# Altium schematic symbol library FPGA_Xilinx_Virtex5.SchLib: 41 symbols (part 20 of 27) (continued)
## XC5VLX330-FF1760 (continued)
part P pins: AJ20 IO_L1N_8 (io), AJ21 IO_L1P_8 (io), AJ22 IO_L0N_8 (io), AJ23 IO_L0P_8 (io), AK20 IO_L3P_8 (io), AK22 IO_L2N_8 (io), AK23 IO_L2P_8 (io), AL20 IO_L3N_8 (io), AL21 IO_L5N_8 (io), AL22 IO_L17P_8 (io), AM21 IO_L5P_8 (io), AM22 IO_L17N_8 (io), AM23 IO_L15P_8 (io), AN20 IO_L7N_8 (io), AN21 IO_L9P_CC_8 (io), AN23 IO_L15N_8 (io), AN24 IO_L13N_8 (io), AP19 VCCO_8 (power), AP20 IO_L7P_8 (io), AP21 IO_L9N_CC_8 (io), AP22 IO_L19N_8 (io), AP23 IO_L13P_8 (io), AP25 IO_L4P_8 (io), AR16 VCCO_8 (power), AR18 IO_L10P_CC_8 (io), AR19 IO_L10N_CC_8 (io), AR20 IO_L14P_8 (io), AR22 IO_L19P_8 (io), AR23 IO_L11P_CC_8 (io), AR24 IO_L11N_CC_8 (io), AR25 IO_L4N_VREF_8 (io), AT16 IO_L12P_VRN_8 (io), AT17 IO_L12N_VRP_8 (io), AT19 IO_L14N_VREF_8 (io), AT20 IO_L16P_8 (io), AT21 IO_L16N_8 (io), AT22 IO_L18N_8 (io), AT24 IO_L8N_CC_8 (io), AT25 IO_L8P_CC_8 (io), AT26 IO_L6N_8 (io), AT27 IO_L6P_8 (io), AU20 VCCO_8 (power), AU21 IO_L18P_8 (io), D19 VCCO_7 (power), F22 IO_L11N_CC_7 (io), G17 IO_L12P_VRN_7 (io), G18 IO_L12N_VRP_7 (io), G19 IO_L10N_CC_7 (io), G20 VCCO_7 (power), G21 IO_L9P_CC_7 (io), G22 IO_L11P_CC_7 (io), G23 IO_L13N_7 (io), G24 IO_L15N_7 (io), G26 IO_L19P_7 (io), H17 VCCO_7 (power), H18 IO_L14N_VREF_7 (io), H19 IO_L10P_CC_7 (io), H20 IO_L9N_CC_7 (io), H21 IO_L7N_7 (io), H23 IO_L13P_7 (io), H24 IO_L15P_7 (io), H25 IO_L17P_7 (io), H26 IO_L19N_7 (io), J18 IO_L14P_7 (io), J20 IO_L16N_7 (io), J21 IO_L7P_7 (io), J22 IO_L8P_CC_7 (io), J23 IO_L8N_CC_7 (io), J25 IO_L17N_7 (io), K20 IO_L16P_7 (io), K22 IO_L6P_7 (io), K23 IO_L6N_7 (io), L20 IO_L18P_7 (io), L21 IO_L18N_7 (io), L22 IO_L4P_7 (io), M21 IO_L5N_7 (io), M22 IO_L4N_VREF_7 (io), M23 IO_L0P_7 (io), N20 IO_L1N_7 (io), N21 IO_L3N_7 (io), N22 IO_L5P_7 (io), N23 IO_L0N_7 (io), P20 IO_L1P_7 (io), P21 IO_L3P_7 (io), P22 IO_L2N_7 (io), P23 IO_L2P_7 (io)
part Q pins: AA21 VREFN_0 (io), AA22 VP_0 (io), AB21 VN_0 (io), AB22 VREFP_0 (io), AC21 DXN_0 (io), AC22 DXP_0 (io), AE30 TCK_0 (io), AF14 TMS_0 (io), AF15 CCLK_0 (io), AF30 M1_0 (io), AG14 TDI_0 (io), AG29 M0_0 (io), AG30 VCCO_0 (power), AH14 TDO_0 (io), AH15 D_OUT_BUSY_0 (io), AH28 M2_0 (io), AL28 VCCO_0 (power), R14 D_IN_0 (io), R30 RDWR_B_0 (io), T14 HSWAPEN_0 (io), T15 DONE_0 (io), T29 PROGRAM_B_0 (io), T30 CS_B_0 (io), U14 INIT_B_0 (io)
part R pins: A3 GND (power), A8 GND (power), A13 GND (power), A18 GND (power), A23 GND (power), A28 GND (power), A33 GND (power), A38 GND (power), AA12 VCCAUX (power), AA14 VCCINT (power), AA16 VCCINT (power), AA18 VCCINT (power), AA20 VCCINT (power), AA24 VCCINT (power), AA26 VCCINT (power), AA28 VCCINT (power), AA30 VCCAUX (power), AB13 VCCINT (power), AB15 VCCINT (power), AB17 VCCINT (power), AB19 VCCINT (power), AB23 VCCINT (power), AB25 VCCINT (power), AB27 VCCINT (power), AB29 VCCAUX (power), AB31 VCCAUX (power), AC12 VCCAUX (power), AC14 VCCINT (power), AC16 VCCINT (power), AC18 VCCINT (power), AC20 VCCINT (power), AC24 VCCINT (power), AC26 VCCINT (power), AC28 VCCINT (power), AC30 VCCAUX (power), AD13 VCCAUX (power), AD15 VCCINT (power), AD17 VCCINT (power), AD19 VCCINT (power), AD21 VCCINT (power), AD23 VCCINT (power), AD25 VCCINT (power), AD27 VCCINT (power), AD29 VCCAUX (power), AE12 VCCAUX (power), AE14 VCCINT (power), AE16 VCCINT (power), AE18 VCCINT (power), AE20 VCCINT (power), AE22 VCCINT (power), AE24 VCCINT (power), AE26 VCCINT (power), AE28 VCCINT (power), AF13 VCCAUX (power), AF17 VCCINT (power), AF19 VCCINT (power), AF21 VCCINT (power), AF23 VCCINT (power), AF25 VCCINT (power), AF27 VCCINT (power), AF29 VCCAUX (power), AG16 VCCINT (power), AG18 VCCINT (power), AG20 VCCINT (power), AG22 VCCINT (power), AG24 VCCINT (power), AG26 VCCINT (power), AG28 VCCINT (power), AH13 VCCAUX (power), AH17 VCCINT (power), AH19 VCCINT (power), AH21 VCCINT (power), AH23 VCCINT (power), AH25 VCCINT (power), AH27 VCCINT (power), AJ24 VCCINT (power), B5 GND (power), B10 GND (power), B20 GND (power), B30 GND (power), B40 GND (power), C2 GND (power), C7 GND (power), C17 GND (power), C27 GND (power), C37 GND (power), C42 GND (power), D4 GND (power), D14 GND (power), D24 GND (power), D34 GND (power), E1 GND (power), E11 GND (power), E21 GND (power), E31 GND (power), E41 GND (power), F8 GND (power), F18 GND (power), F28 GND (power), F38 GND (power), G5 GND (power), G15 GND (power), G25 GND (power), G35 GND (power), H2 GND (power), H12 GND (power), H22 GND (power), H32 GND (power), H42 GND (power), J9 GND (power), J19 GND (power), J29 GND (power), J34 GND (power), J39 GND (power), K1 GND (power), K6 GND (power), K11 GND (power), K16 GND (power), K21 GND (power), K26 GND (power), K31 GND (power), K36 GND (power), L3 GND (power), L13 GND (power), L18 GND (power), L23 GND (power), L28 GND (power), L33 GND (power), M10 GND (power), M15 GND (power), M20 GND (power), M25 GND (power), M30 GND (power), M40 GND (power), N2 GND (power), N7 GND (power), N12 GND (power), N17 GND (power), N27 GND (power), N32 GND (power), N37 GND (power), N42 GND (power), P4 GND (power), P14 GND (power), P19 GND (power), P24 GND (power), P29 GND (power), P34 GND (power), R1 GND (power), R11 GND (power), R12 VCCAUX (power), R13 GND (power), R16 GND (power), R19 GND (power), R20 VCCINT (power), R21 GND (power), R22 VCCINT (power), R23 GND (power), R24 VCCINT (power), R25 GND (power), R26 VCCINT (power), R29 VBATT_0 (power), R31 GND (power), R41 GND (power), T8 GND (power), T12 GND (power), T13 VCCAUX (power), T16 GND (power), T17 VCCINT (power), T18 GND (power), T19 VCCINT (power), T20 GND (power), T21 VCCINT (power), T22 GND (power), T23 VCCINT (power), T24 GND (power), T25 VCCINT (power), T26 GND (power), T27 VCCINT (power), T28 GND (power), T33 GND (power), U12 VCCAUX (power), U16 VCCINT (power), U18 VCCINT (power), U20 VCCINT (power), U22 VCCINT (power), U24 VCCINT (power), U26 VCCINT (power), U28 VCCINT (power), U30 VCCAUX (power), V13 VCCINT (power), V15 VCCINT (power), V17 VCCINT (power), V19 VCCINT (power), V21 VCCINT (power), V23 VCCINT (power), V25 VCCINT (power), V27 VCCINT (power), V29 VCCAUX (power), W12 VCCAUX (power), W14 VCCINT (power), W16 VCCINT (power), W18 VCCINT (power), W20 VCCINT (power), W22 VCCINT (power), W24 VCCINT (power), W26 VCCINT (power), W28 VCCINT (power), W30 VCCAUX (power), Y13 VCCINT (power), Y15 VCCINT (power), Y17 VCCINT (power), Y19 VCCINT (power), Y21 AVSS_0 (power), Y22 AVDD_0 (power), Y23 VCCINT (power), Y25 VCCINT (power), Y27 VCCINT (power), Y29 VCCINT (power), Y31 VCCAUX (power)
part S pins: AA3 GND (power), AA13 GND (power), AA15 GND (power), AA17 GND (power), AA19 GND (power), AA23 GND (power), AA25 GND (power), AA27 GND (power), AA29 GND (power), AA31 GND (power), AA33 GND (power), AB10 GND (power), AB12 GND (power), AB14 GND (power), AB16 GND (power), AB18 GND (power), AB20 GND (power), AB24 GND (power), AB26 GND (power), AB28 GND (power), AB30 GND (power), AB40 GND (power), AC2 GND (power), AC7 GND (power), AC13 GND (power), AC15 GND (power), AC17 GND (power), AC19 GND (power), AC23 GND (power), AC25 GND (power), AC27 GND (power), AC29 GND (power), AC31 GND (power), AC32 GND (power), AC37 GND (power), AC42 GND (power), AD4 GND (power), AD12 GND (power), AD14 GND (power), AD16 GND (power), AD18 GND (power), AD20 GND (power), AD22 GND (power), AD24 GND (power), AD26 GND (power), AD28 GND (power), AD30 GND (power), AD34 GND (power), AE1 GND (power), AE11 GND (power), AE13 GND (power), AE15 GND (power), AE17 GND (power), AE19 GND (power), AE21 GND (power), AE23 GND (power), AE25 GND (power), AE27 GND (power), AE29 GND (power), AE31 GND (power), AE41 GND (power), AF8 GND (power), AF16 GND (power), AF18 GND (power), AF20 GND (power), AF22 GND (power), AF24 GND (power), AF26 GND (power), AF28 GND (power), AF33 GND (power), AF38 GND (power), AG5 GND (power), AG13 GND (power), AG15 GND (power), AG17 GND (power), AG19 GND (power), AG21 GND (power), AG23 GND (power), AG25 GND (power), AG27 GND (power), AG35 GND (power), AH2 GND (power), AH12 GND (power), AH18 GND (power), AH20 GND (power), AH22 GND (power), AH24 GND (power), AH26 GND (power), AH32 GND (power), AH42 GND (power), AJ9 GND (power), AJ14 GND (power), AJ19 GND (power), AJ29 GND (power), AJ39 GND (power), AK1 GND (power), AK6 GND (power), AK11 GND (power), AK16 GND (power), AK21 GND (power), AK26 GND (power), AK31 GND (power), AK36 GND (power), AK41 GND (power), AL3 GND (power), AL13 GND (power), AL18 GND (power), AL23 GND (power), AL33 GND (power), AM10 GND (power), AM15 GND (power), AM20 GND (power), AM25 GND (power), AM30 GND (power), AM40 GND (power), AN2 GND (power), AN7 GND (power), AN12 GND (power), AN17 GND (power), AN22 GND (power), AN27 GND (power), AN32 GND (power), AN37 GND (power), AN42 GND (power), AP4 GND (power), AP14 GND (power), AP24 GND (power), AP29 GND (power), AP34 GND (power), AR1 GND (power), AR11 GND (power), AR21 GND (power), AR31 GND (power), AR41 GND (power), AT8 GND (power), AT18 GND (power), AT28 GND (power), AT38 GND (power), AU5 GND (power), AU15 GND (power), AU25 GND (power), AU35 GND (power), AV2 GND (power), AV12 GND (power), AV22 GND (power), AV32 GND (power), AV42 GND (power), AW9 GND (power), AW19 GND (power), AW29 GND (power), AW39 GND (power), AY1 GND (power), AY6 GND (power), AY16 GND (power), AY26 GND (power), AY36 GND (power), AY41 GND (power), BA3 GND (power), BA13 GND (power), BA23 GND (power), BA33 GND (power), BA38 GND (power), BB5 GND (power), BB10 GND (power), BB15 GND (power), BB20 GND (power), BB25 GND (power), BB30 GND (power), BB35 GND (power), BB40 GND (power), T38 GND (power), U5 GND (power), U10 GND (power), U13 GND (power), U15 GND (power), U17 GND (power), U19 GND (power), U21 GND (power), U23 GND (power), U25 GND (power), U27 GND (power), U29 GND (power), U35 GND (power), V2 GND (power), V12 GND (power), V14 GND (power), V16 GND (power), V18 GND (power), V20 GND (power), V22 GND (power), V24 GND (power), V26 GND (power), V28 GND (power), V30 GND (power), V32 GND (power), V42 GND (power), W9 GND (power), W13 GND (power), W15 GND (power), W17 GND (power), W19 GND (power), W21 GND (power), W23 GND (power), W25 GND (power), W27 GND (power), W29 GND (power), W31 GND (power), W34 GND (power), W39 GND (power), Y1 GND (power), Y6 GND (power), Y11 GND (power), Y12 GND (power), Y14 GND (power), Y16 GND (power), Y18 GND (power), Y20 GND (power), Y24 GND (power), Y26 GND (power), Y28 GND (power), Y30 GND (power), Y36 GND (power)

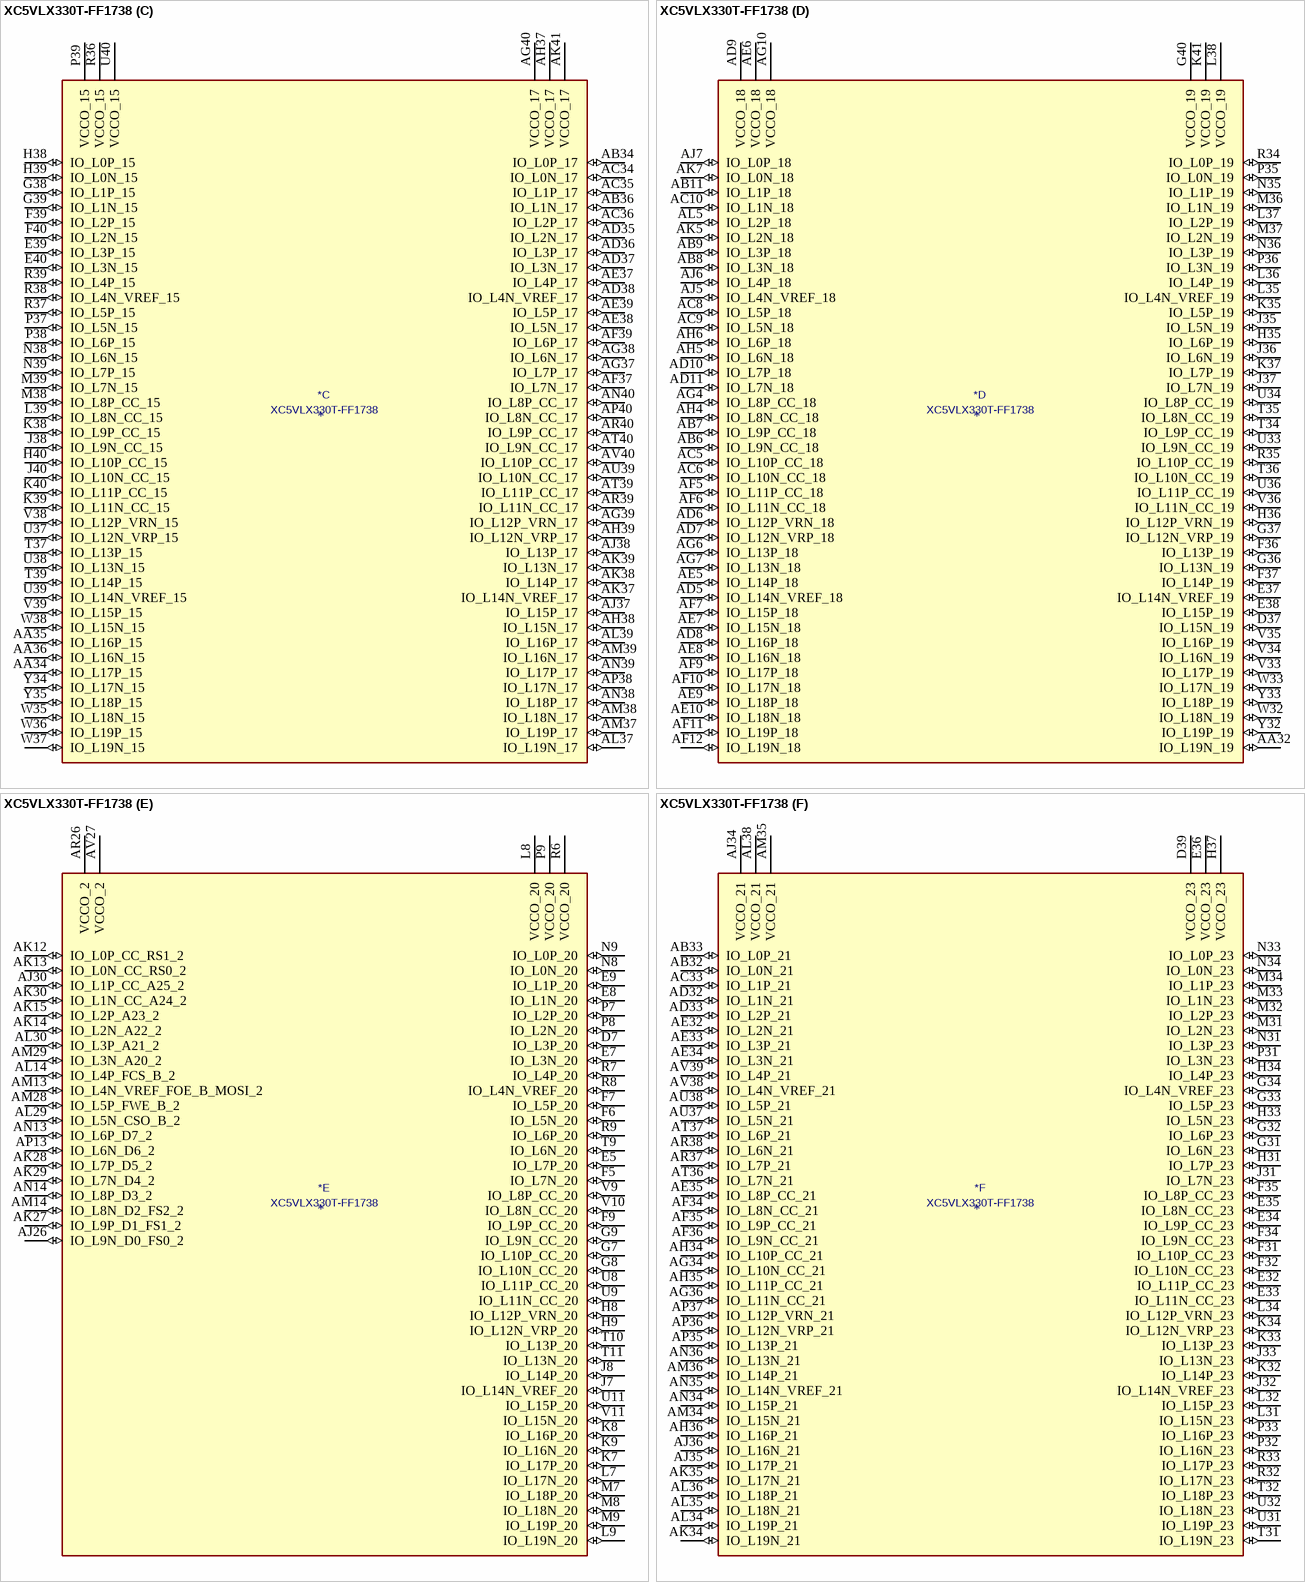
[diagram p104: symbol XC5VLX330T-FF1738]

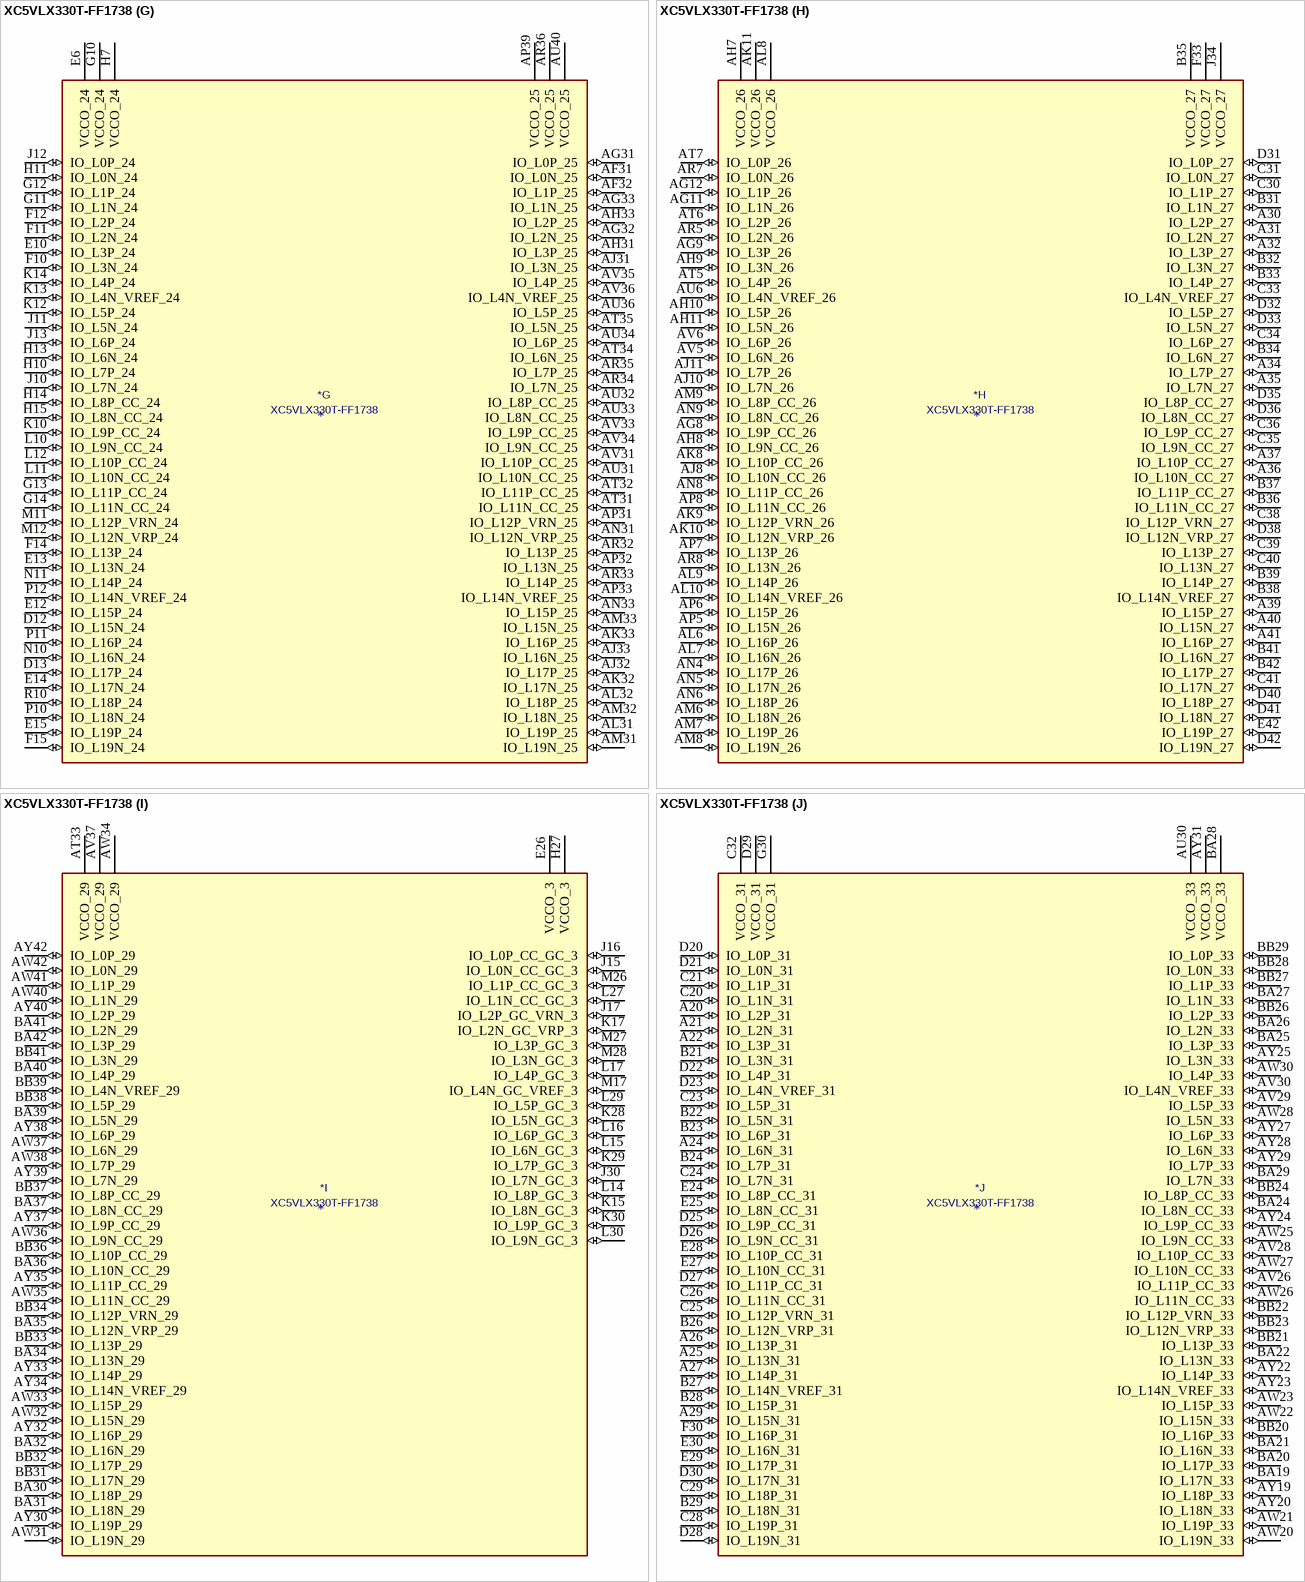
[diagram p105: symbol XC5VLX330T-FF1738]

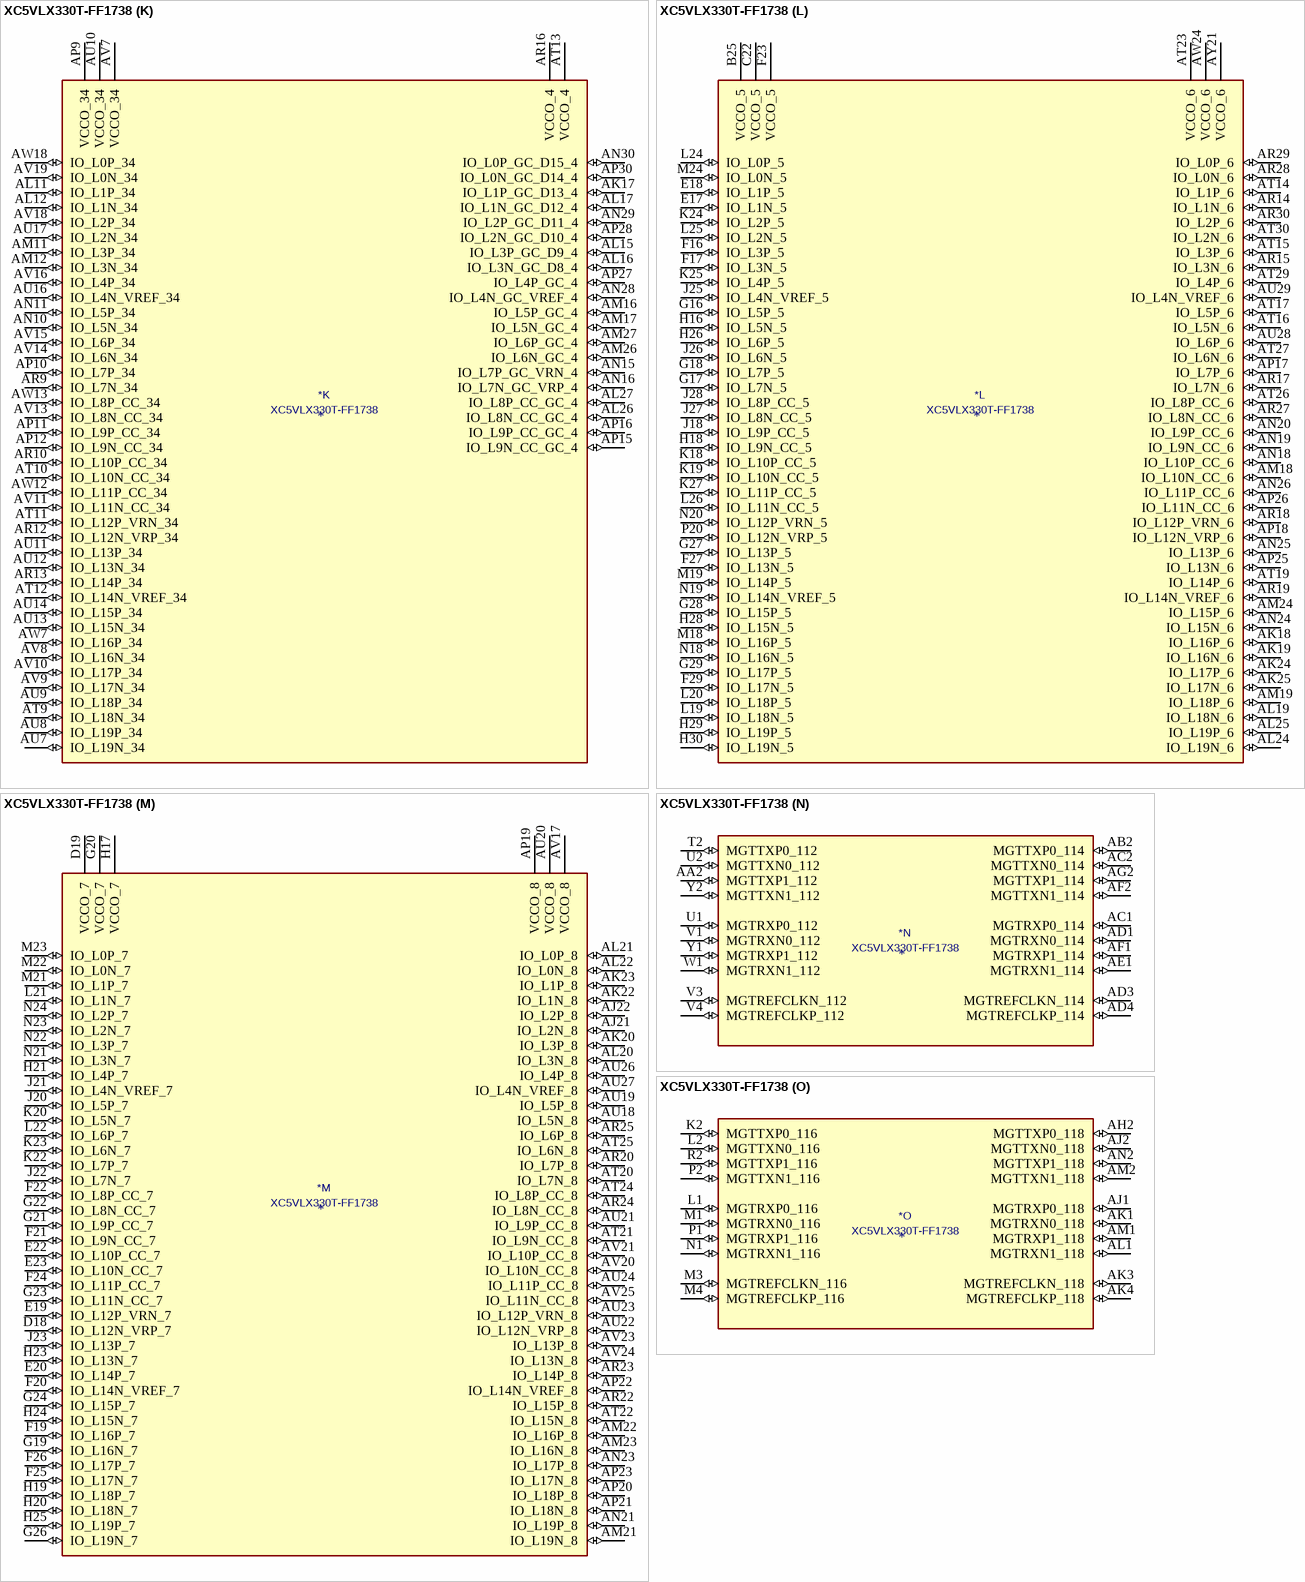
[diagram p106: symbol XC5VLX330T-FF1738]

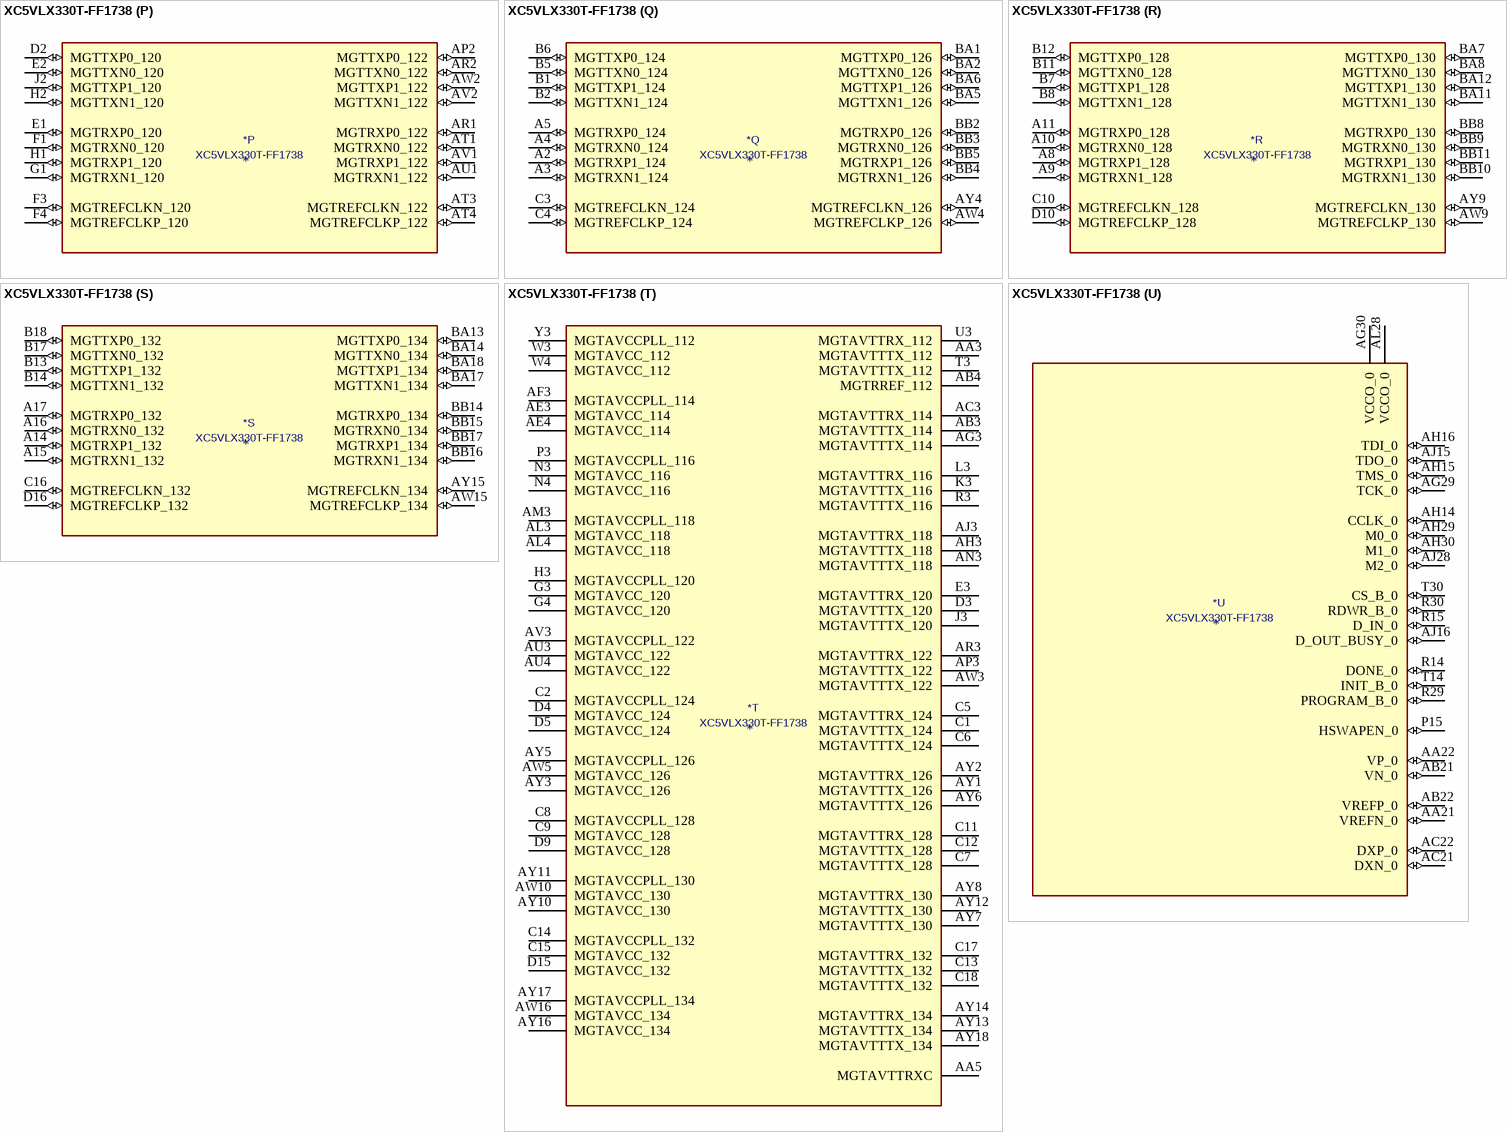
[diagram p107: symbol XC5VLX330T-FF1738]

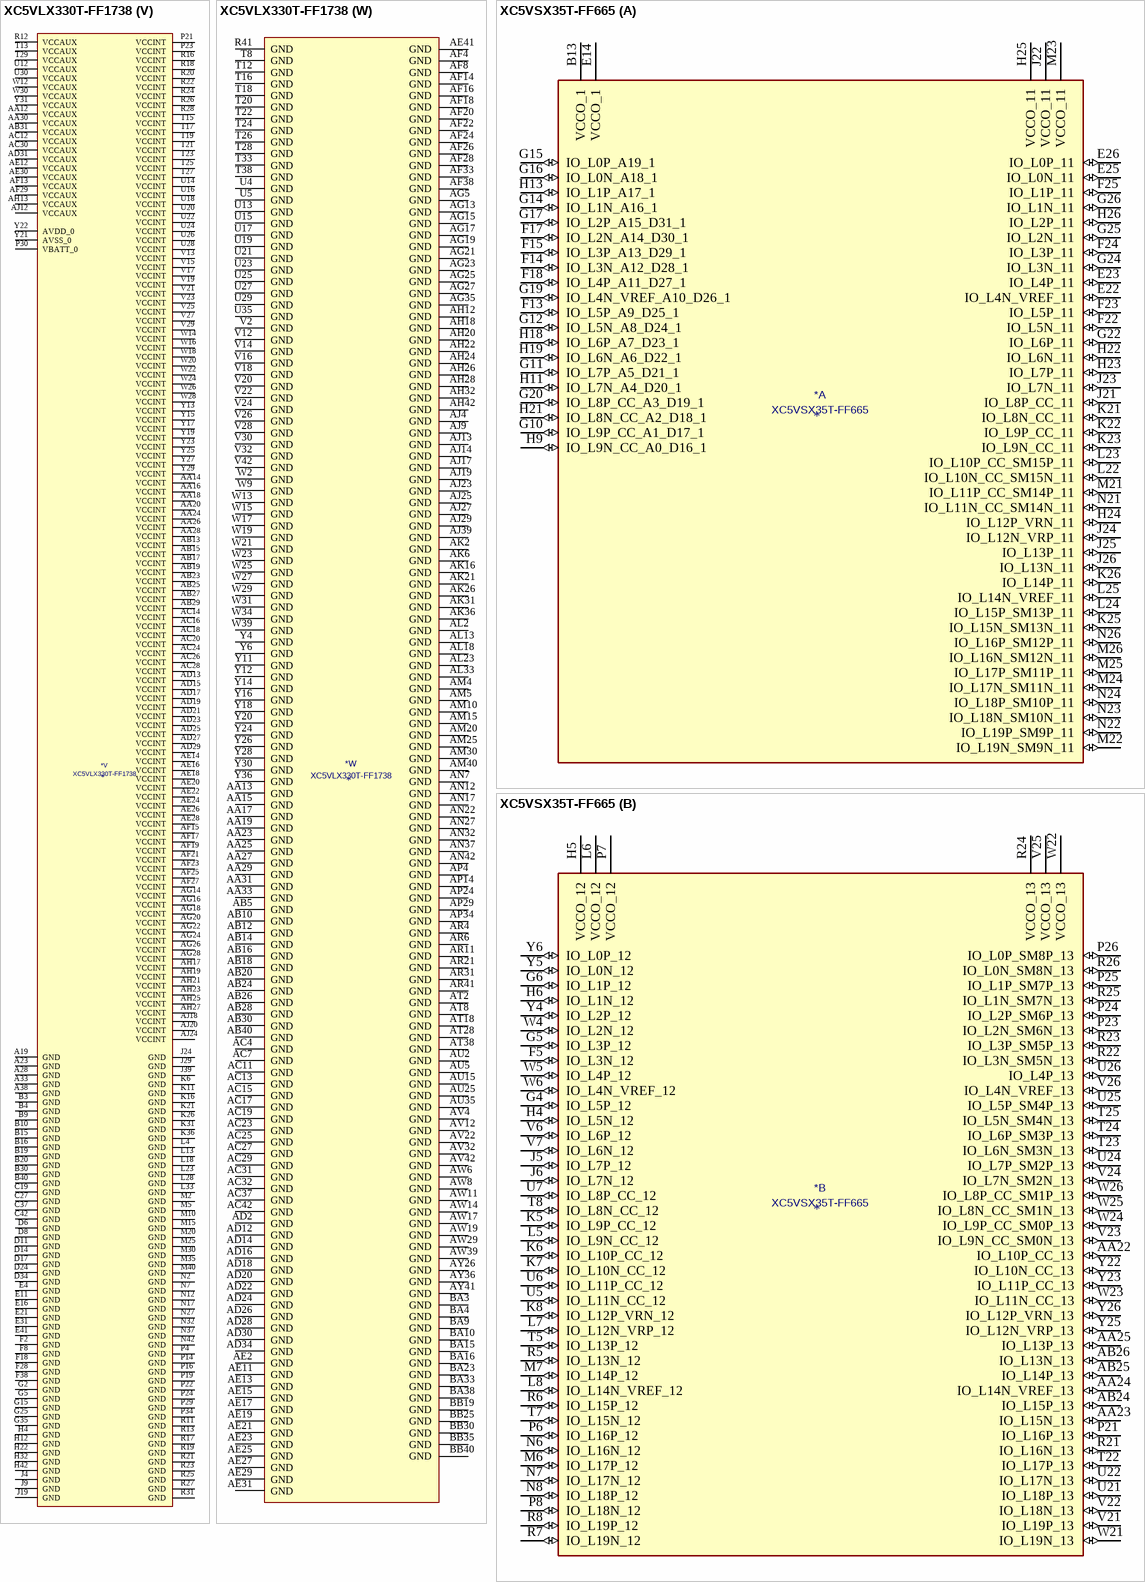
[diagram p108: symbols XC5VLX330T-FF1738 to XC5VSX35T-FF665]